# Altium footprint library highpower.PcbLib: 29 footprints (part 2 of 2)
Each footprint in its own frame and in the unit in brackets; x right, y up, seen from the top. Pads: shape width x height; smd on the part's side, far side on the other; paste and mask are expansions set on the pad; w line width, h text height; cw(c..) or ccw(c..) is an arc to the next point about the centre after c.
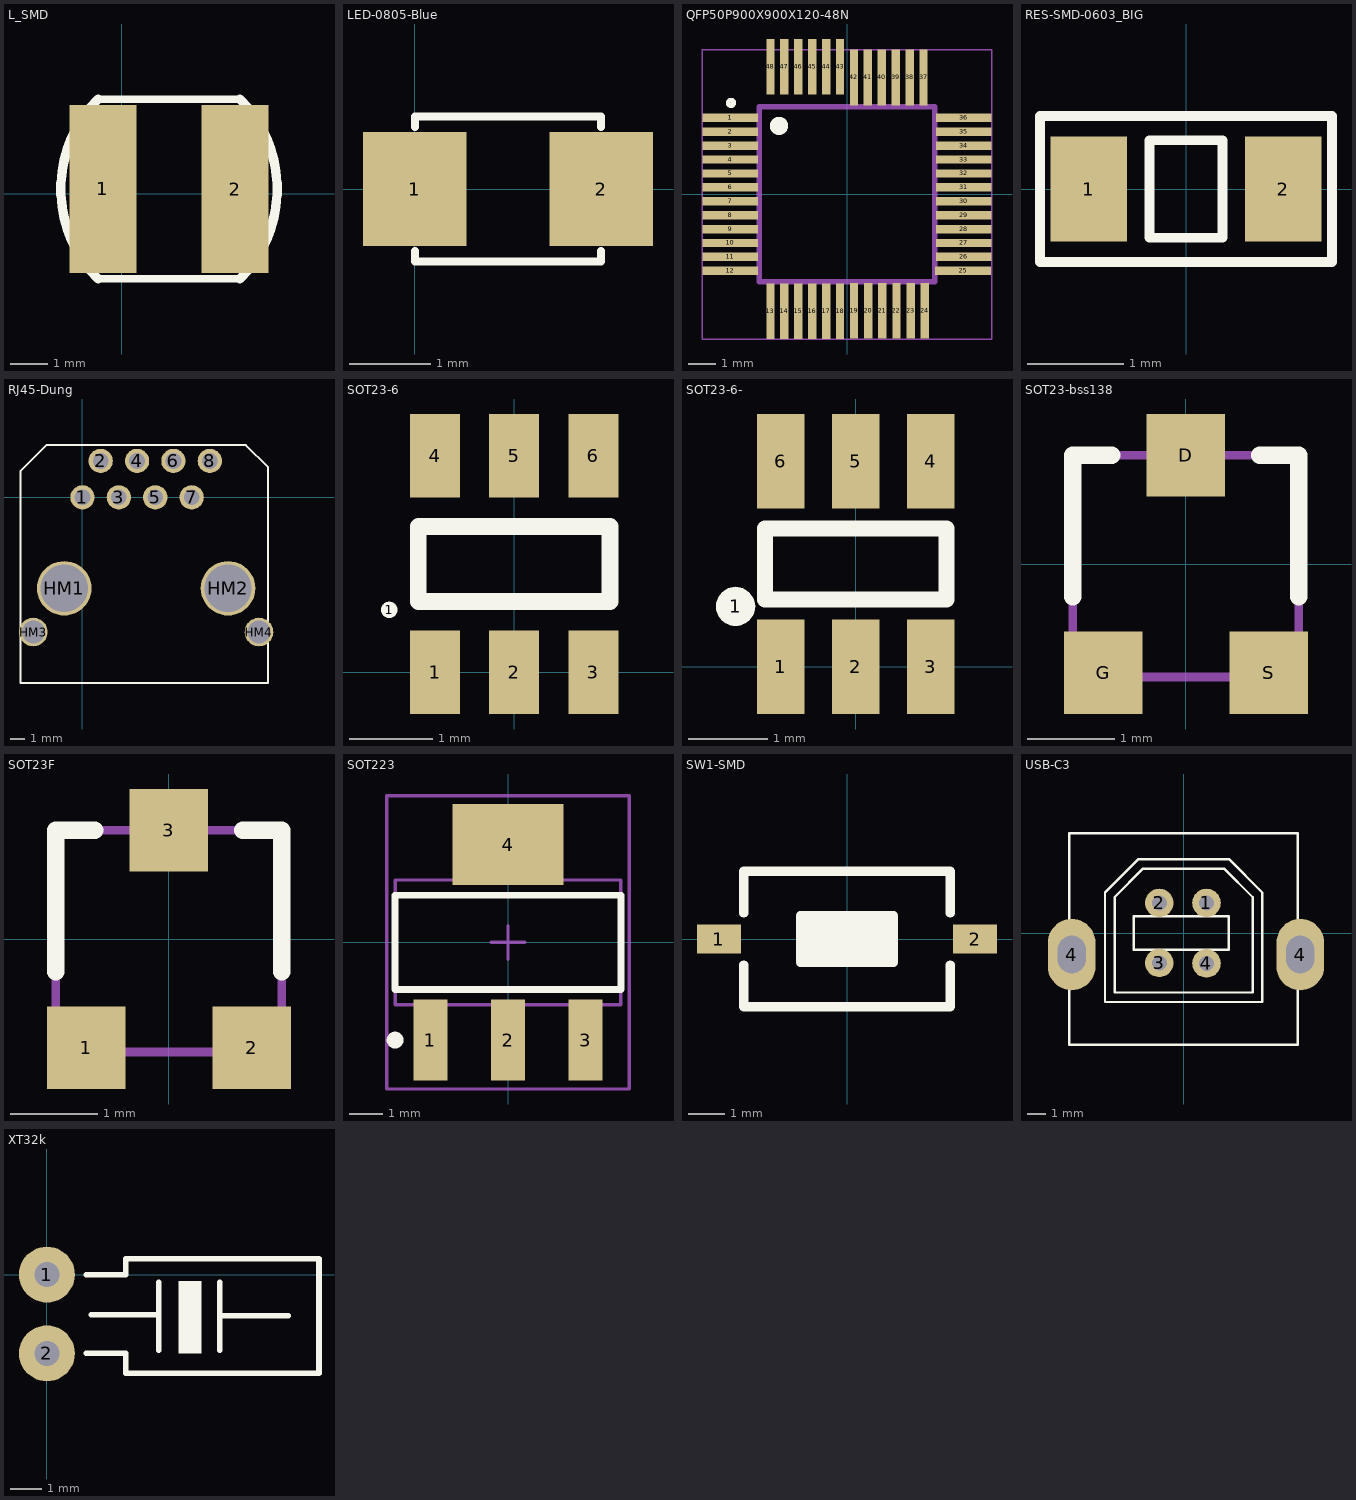
[diagram p1: the footprints below, top view; thin cyan lines are the x and y axes]

## L_SMD [mm] "4.5x5mm"
height 3.5
pads (2):
  rect 1.8x4.5 smd: 1(-0.508,0.127) 2(3.048,0.127)
Top Overlay:
  lines w0.2: -0.635,-2.286 3.175,-2.286 ; -0.635,2.54 3.175,2.54
  lines w0.254: -0.635,-2.286 cw(c1.778,0.127) -0.635,2.54 ; 3.175,-2.286 ccw(c0.762,0.127) 3.175,2.54

## LED-0805-Blue [mil]
pads (2):
  rect 50x55 smd: 1(0,0) 2(90,0)
Top Overlay:
  lines w4: 0,-30 0,-35 90,-35 90,-30 ; 0,30 0,35 90,35 90,30
3D body "User Library-led_0805-blue.step": height 43.31, standoff 0, extent 5.24,-24.6 84.77,24.61

## QFP50P900X900X120-48N [mm]
pads (48):
  rect 2x0.3 smd: 1(-4.2,2.75) 2(-4.2,2.25) 3(-4.2,1.75) 4(-4.2,1.25) 5(-4.2,0.75) 6(-4.2,0.25) 7(-4.2,-0.25) 8(-4.2,-0.75) 9(-4.2,-1.25) 10(-4.2,-1.75) 11(-4.2,-2.25) 12(-4.2,-2.75) 25(4.17,-2.75) 26(4.2,-2.25) 27(4.2,-1.75) 28(4.2,-1.25) 29(4.2,-0.75) 30(4.2,-0.25) 31(4.2,0.25) 32(4.2,0.75) 33(4.2,1.25) 34(4.2,1.75) 35(4.2,2.25) 36(4.2,2.75)
  rect 0.3x2 smd: 13(-2.75,-4.2) 14(-2.25,-4.2) 15(-1.75,-4.2) 16(-1.25,-4.2) 17(-0.75,-4.2) 18(-0.25,-4.2) 19(0.254,-4.191) 20(0.762,-4.191) 21(1.27,-4.191) 22(1.778,-4.191) 23(2.286,-4.191) 24(2.794,-4.191) 37(2.75,4.2) 38(2.25,4.2) 39(1.75,4.2) 40(1.25,4.2) 41(0.75,4.2) 42(0.25,4.2) 43(-0.25,4.581) 44(-0.75,4.581) 45(-1.25,4.581) 46(-1.75,4.581) 47(-2.25,4.581) 48(-2.75,4.581)
Top Overlay:
  circle w0.17: c-4.17,3.283 r0.1
  circle w0.4: c-2.443,2.458 r0.127
Mechanical 13:
  lines w0.2: -3.15,-3.15 3.15,-3.15 3.15,3.15 -3.15,3.15 -3.15,-3.15
Mechanical 15:
  lines w0.05: -5.2,-5.2 5.2,-5.2 5.2,5.2 -5.2,5.2 -5.2,-5.2
3D body "User Library-P-LQFP48-7x7-0_50.STEP": height 1.41, standoff -0.04, extent -4.5,-4.555 4.5,4.445

## RES-SMD-0603_BIG [mm]
pads (2):
  rect 0.8x1.1 smd: 1(-1.016,0) 2(1.016,0)
Top Overlay:
  lines w0.1: -1.524,-0.762 -1.524,0.762 1.524,0.762 1.524,-0.762 0.508,-0.762 -1.524,-0.762 ; -0.381,-0.508 -0.381,0.508 0.381,0.508 0.381,-0.508 -0.381,-0.508
3D body "User Library-SMD RESISTOR-1 (3).step": height 0.43, standoff -0.03, extent -0.8,-0.4 0.8,0.4

## RJ45-Dung [mm]
pads (12):
  round 1.7 hole 1.1: 1(0,0) 2(1.27,2.54) 3(2.54,0) 4(3.81,2.54) 5(5.08,0) 6(6.35,2.54) 7(7.62,0) 8(8.89,2.54)
  round 3.81 hole 3.3: HM1(-1.27,-6.35) HM2(10.16,-6.35)
  round 2 hole 1.6: HM3(-3.43,-9.4) HM4(12.32,-9.4)
Top Overlay:
  pour cut-out: 16.51,-2.54
  lines w0.127: -1.77,-7.764 cw(c-1.27,-6.35) -1.517,-7.829 ; -0.77,-7.764 ccw(c-1.27,-6.35) -0.77,-4.936 ; -0.132,-0.1 -0.132,0.1 ; 0.132,-0.1 0.132,0.1 ; 1.138,2.44 1.138,2.64 ; 1.402,2.44 1.402,2.64 ; 2.408,-0.1 2.408,0.1 ; 2.672,-0.1 2.672,0.1 ; 3.678,2.44 3.678,2.64 ; 3.942,2.44 3.942,2.64 ; 4.948,-0.1 4.948,0.1 ; 5.212,-0.1 5.212,0.1 ; 6.218,2.44 6.218,2.64 ; 6.482,2.44 6.482,2.64 ; 7.488,-0.1 7.488,0.1 ; 7.752,-0.1 7.752,0.1 ; 8.758,2.44 8.758,2.64 ; 9.022,2.44 9.022,2.64 ; 9.66,-7.764 cw(c10.16,-6.35) 9.66,-4.936 ; 10.16,-7.85 cw(c10.16,-6.35) 10.66,-7.764 ; -4.318,-12.954 -4.318,1.852 -2.52,3.65 11.41,3.65 12.954,2.106 12.954,-12.954 -4.318,-12.954 ; -1.77,-7.386 cw(c-1.27,-6.35) -1.77,-5.314 -1.77,-7.386 ; -0.77,-7.386 ccw(c-1.27,-6.35) -0.77,-5.314 -0.77,-7.386 ; -0.175,-0.1 -0.175,0.1 0.175,0.1 0.175,-0.1 -0.175,-0.1 ; 1.095,2.44 1.095,2.64 1.445,2.64 1.445,2.44 1.095,2.44 ; 2.365,-0.1 2.365,0.1 2.715,0.1 2.715,-0.1 2.365,-0.1 ; 3.635,2.44 3.635,2.64 3.985,2.64 3.985,2.44 3.635,2.44 ; 4.905,-0.1 5.255,-0.1 5.255,0.1 4.905,0.1 4.905,-0.1 ; 6.175,2.44 6.525,2.44 6.525,2.64 6.175,2.64 6.175,2.44 ; 7.445,-0.1 7.445,0.1 7.795,0.1 7.795,-0.1 7.445,-0.1 ; 8.715,2.44 8.715,2.64 9.065,2.64 9.065,2.44 8.715,2.44 ; 9.66,-7.386 cw(c10.16,-6.35) 9.66,-5.314 9.66,-7.386 ; 10.66,-7.386 ccw(c10.16,-6.35) 10.66,-5.314 10.66,-7.386
3D body: height 0.25, standoff 0, extent 4.826,-3.175 4.826,-3.175
3D body: height 0.25, standoff 0, extent 6.731,-2.794 6.731,-2.794
3D body: height 0.25, standoff 0, extent 0,0 0,0
3D body: height 0.25, standoff 0, extent 12.065,-3.048 12.065,-3.048
3D body "ACC-M-RJE88-188-1XX0-REVT2.STEP": height 12.96, standoff -3.64, extent -3.273,-12.528 13.183,2.372

## SOT23-6 [mm] "SOT143-4 as used in SP0503BAHTG"
pads (7):
  round 0.2 on Top Overlay: 1(-1.5,0.75)
  rect 0.6x1 smd: 1(-0.95,0) 2(0,0) 3(0.95,0) 4(-0.95,2.6) 5(0,2.6) 6(0.95,2.6)
Top Overlay:
  lines w0.2: -1.15,0.85 1.15,0.85 1.15,1.75 -1.15,1.75 -1.15,0.85
3D body "SOT236.step": height 1, standoff 0, extent -1.46,0.13 1.46,2.47

## SOT23-6- [mm] "SOT143-4 as used in SP0503BAHTG"
pads (7):
  round 0.5 on Top Overlay: 1(-1.524,0.762)
  rect 0.6x1.2 smd: 1(-0.95,0) 2(0,0) 3(0.95,0) 4(0.95,2.6) 5(0,2.6) 6(-0.95,2.6)
Top Overlay:
  lines w0.2: -1.15,0.85 1.15,0.85 1.15,1.75 -1.15,1.75 -1.15,0.85
3D body "SOT236.step": height 1, standoff 0, extent -1.46,0.13 1.46,2.47

## SOT23-bss138 [mm] "SOT23, 1=bottom-left, 2=top, 3=bottom-right"
height 1.1
pads (3):
  rect 0.9x0.95 smd: D(0,1.25) G(-0.95,-1.25) S(0.955,-1.25)
Top Overlay:
  lines w0.2: -1.3,-0.375 -1.3,1.25 -0.85,1.25 ; 0.85,1.25 1.3,1.25 1.3,-0.375
Mechanical 7:
  region: 1.225,-1.275 0.625,-1.275 0.625,-1.525 1.225,-1.525
  region: -0.625,-1.275 -1.225,-1.275 -1.225,-1.525 -0.625,-1.525
  rectangle: -0.3,1.25 0.3,1.5
  lines w0.1: -1.3,-1.3 1.3,-1.3 1.3,1.25 -1.3,1.25 -1.3,-1.3
  text ".Designator" at -1.2,0.75 h1.1
  text ".Comment" at -1.2,0.325 h1.1
3D body "SW3DPS-SOT-23-DEFAULT.STEP": height 1.06, standoff -0.04, extent -1.524,-1.23 1.476,1.27

## SOT23F [mm] "SOT23, 1G 2S 3D"
height 1.1
pads (3):
  rect 0.9x0.95 smd: 1(-0.95,-1.25) 2(0.955,-1.25) 3(0,1.25)
Top Overlay:
  lines w0.2: -1.3,-0.375 -1.3,1.25 -0.85,1.25 ; 0.85,1.25 1.3,1.25 1.3,-0.375
Mechanical 7:
  region: 1.225,-1.275 0.625,-1.275 0.625,-1.525 1.225,-1.525
  region: -0.625,-1.275 -1.225,-1.275 -1.225,-1.525 -0.625,-1.525
  rectangle: -0.3,1.25 0.3,1.5
  lines w0.1: -1.3,-1.3 1.3,-1.3 1.3,1.25 -1.3,1.25 -1.3,-1.3
  text ".Designator" at -1.2,0.75 h1.1
  text ".Comment" at -1.2,0.325 h1.1
3D body "SW3DPS-SOT-23-DEFAULT.STEP": height 1.06, standoff -0.04, extent -1.524,-1.23 1.476,1.27

## SOT223 [mm]
pads (4):
  rect 1x2.4 smd: 1(-2.3,-2.9) 2(0,-2.9) 3(2.3,-2.9)
  rect 3.3x2.4 smd: 4(0,2.9)
Top Overlay:
  circle w0.25: c-3.35,-2.9 r0.125
  lines w0.2: -3.35,-1.4 3.35,-1.4 3.35,1.4 -3.35,1.4 -3.35,-1.4
Mechanical 13:
  lines w0.1: -3.35,-1.85 3.35,-1.85 3.35,1.85 -3.35,1.85 -3.35,-1.85
Mechanical 15:
  lines w0.1: -0.5,0 0.5,0 ; 0,-0.5 0,0.5 ; -3.6,-4.35 3.6,-4.35 3.6,4.35 -3.6,4.35 -3.6,-4.35
3D body "SW3DPS-SOT-223-DEFAULT.step": height 1.68, standoff 0, extent -3.25,-3.556 3.25,3.404

## SW1-SMD [mm]
pads (2):
  rect 1.2x0.8 smd: 1(-3.5,0) 2(3.5,0)
Top Overlay:
  rectangle: -1.27,-0.635 1.27,0.635
  lines w0.254: -2.819,-0.711 -2.819,-1.854 2.819,-1.854 2.819,-0.711 ; -2.819,0.711 -2.819,1.854 2.819,1.854 2.819,0.711 ; -1.27,-0.635 -1.27,0.635 1.27,0.635 1.27,-0.635 -1.27,-0.635
3D body "User Library-Button-SMD.step": height 2.5, standoff 0, extent -3.05,-1.85 3.05,1.85

## USB-C3 [mil]
pads (6):
  round 60 hole 31.5 mask+2: 1(48,63.5) 2(-51,63.5) 3(-51,-62.5) 4(48,-63.5)
  oval 100x150 hole 59.06 slot 78.74 at 90 deg mask+2: 4(-235,-45) 4(245,-45)
Top Overlay:
  lines w5: -165,-234.5 125,-234.5 ; -240,-234.5 -240,-144.5 -240,185.5 -240,210 240,210 240,-234.5 -240,-234.5 ; -165,-144.5 -165,85.5 -95,155.5 65,155.5 95,155.5 165,85.5 165,-144.5 -165,-144.5 ; -145,-124.5 145,-124.5 145,75.5 85,135.5 -85,135.5 -145,75.5 -145,-124.5 ; -105,-34.5 -105,35.5 95,35.5 95,-34.5 -105,-34.5
3D body "usb_a-usb_b-top-c.stp": height 633.86, standoff -155.36, extent -290.12,-235.13 288.62,209.76

## XT32k [mm]
pads (2):
  round 1.8 hole 0.813: 1(0,0) 2(0,-2.54)
Top Overlay:
  rectangle: 4.242,-2.54 4.978,-0.203
  lines w0.178: 1.27,-2.54 2.54,-2.54 2.54,-3.175 8.763,-3.175 8.763,0.508 2.54,0.508 2.54,0 1.27,0 ; 1.422,-1.295 3.607,-1.295 ; 3.607,-2.438 3.607,-0.254 ; 5.563,-2.438 5.563,-0.254 ; 5.588,-1.321 7.772,-1.321
3D body "User Library-KX-26.step": height 1.95, standoff -2, extent -0.145,-2.42 8.205,-0.12